# Altium schematic symbol library LTSpiceLibrary.SchLib: 776 symbols (part 2 of 3) (continued)
## LT1723 (continued)
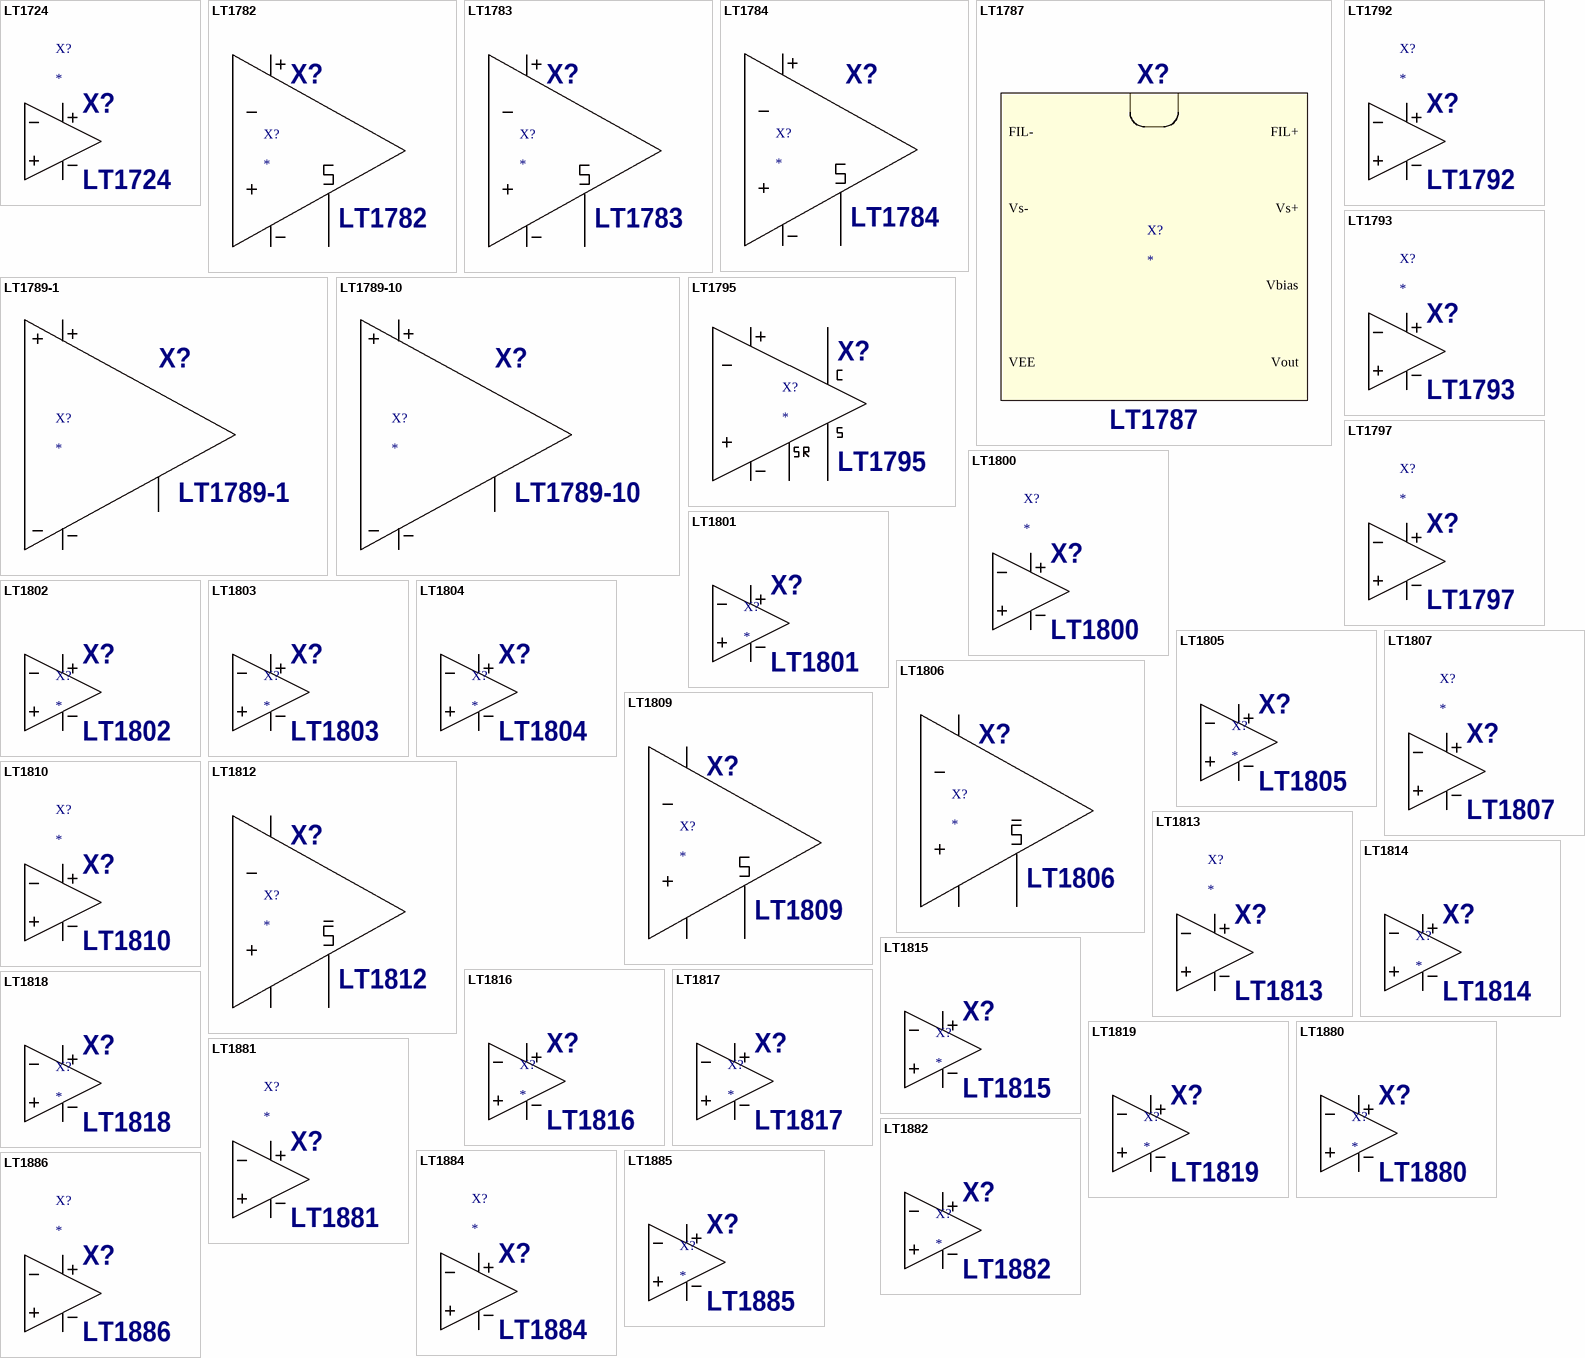
[diagram p11: symbols LT1724 to LT1886]

## LT1724
designator X?  value LT1724  InstName: X?
Prefix: X; Value2: LT1722; Description: Quad 200MHz Low Noise Precision Operational Amplifier; SpiceModel: LTC.lib
pins: 1 In+, 2 In-, 3 V+, 4 V-, 5 OUT

## LT1782
designator X?  value LT1782  InstName: X?
Prefix: X; Description: �Power Over-The-Top, SOT-23, Rail-to-Rail Input and Output Operational Amplifier; SpiceModel: LTC.lib; Value2: LT1782
pins: 1 In+, 2 In-, 3 V+, 4 V-, 5 OUT, 6 SHDN

## LT1783
designator X?  value LT1783  InstName: X?
Prefix: X; Description: 1.2MHz �Power Over-The-Top, SOT-23, Rail-to-Rail Input and Output Operational Amplifier; SpiceModel: LTC.lib; Value2: LT1783
pins: 1 In+, 2 In-, 3 V+, 4 V-, 5 OUT, 6 SHDN

## LT1784
designator X?  value LT1784  InstName: X?
Prefix: X; Description: 2.5MHz Over-The-Top Rail-to-Rail Op Amp; SpiceModel: LTC2.LIB; Value2: LT1784
pins: 1 IN+, 2 IN-, 3 OUT, 4 VCC, 5 VEE, 6 SHDN

## LT1787
designator X?  value LT1787  InstName: X?
Prefix: X; Description: Precision, High Side Current Sense Amplifier; SpiceModel: LTC.lib; Value2: LT1787
pins: 1 FIL-, 2 Vs-, 3 VEE, 4 Vout, 5 Vbias, 6 Vs+, 7 FIL+

## LT1789-1
designator X?  value LT1789-1  InstName: X?
Prefix: X; Description: �Power, Single Supply Rail-to-Rail Output Instrumentation Amplifier; SpiceModel: LTC3.lib; Value2: LT1789-1
pins: 1 RG1, 2 IN-, 3 IN+, 4 VEE, 5 REF, 6 OUT, 7 VCC, 8 RG2

## LT1789-10
designator X?  value LT1789-10  InstName: X?
Prefix: X; Description: �Power, Single Supply Rail-to-Rail Output Instrumentation Amplifier; SpiceModel: LTC3.lib; Value2: LT1789-10
pins: 1 RG1, 2 IN-, 3 IN+, 4 VEE, 5 REF, 6 OUT, 7 VCC, 8 RG2

## LT1792
designator X?  value LT1792  InstName: X?
Prefix: X; Description: Low Noise, Precision, JFET Input Operational Amplifier; SpiceModel: LTC.lib; Value2: LT1792
pins: 1 In+, 2 In-, 3 V+, 4 V-, 5 OUT

## LT1793
designator X?  value LT1793  InstName: X?
Prefix: X; Description: Low Noise, Picoampere Bias Current, JFET Input Operational Amplifier; SpiceModel: LTC.lib; Value2: LT1793
pins: 1 In+, 2 In-, 3 V+, 4 V-, 5 OUT

## LT1795
designator X?  value LT1795  InstName: X?
Prefix: X; Description: Dual 500mA/50MHz Current Feedback Amplifier/xDSL Line Driver; SpiceModel: LTC.lib; Value2: LT1795
pins: 1 In+, 2 In-, 3 V+, 4 V-, 5 OUT, 6 SHDNREF, 7 SHDN, 8 COMP

## LT1797
designator X?  value LT1797  InstName: X?
Prefix: X; Description: 10MHz, Rail-to-Rail Input and Output Op Amp in SOT-23; SpiceModel: LTC.lib; Value2: LT1797
pins: 1 In+, 2 In-, 3 V+, 4 V-, 5 OUT

## LT1800
designator X?  value LT1800  InstName: X?
Prefix: X; Description: 80MHz, 25V/�s Low Power Rail-to-Rail Input and Output Precision Op Amp; SpiceModel: LTC.lib; Value2: LT1800
pins: 1 In+, 2 In-, 3 V+, 4 V-, 5 OUT

## LT1801
designator X?  value LT1801  InstName: X?
Prefix: X; Value2: LT1800; Description: Dual 80MHz, 25V/�s Low Power Rail-to-Rail Input and Output Precision Op Amp(1 of 2); SpiceModel: LTC.lib
pins: 1 In+, 2 In-, 3 V+, 4 V-, 5 OUT

## LT1802
designator X?  value LT1802  InstName: X?
Prefix: X; Value2: LT1800; Description: Quad 80MHz, 25V/�s Low Power Rail-to-Rail Input and Output Precision Op Amp(1 of 4); SpiceModel: LTC.lib
pins: 1 In+, 2 In-, 3 V+, 4 V-, 5 OUT

## LT1803
designator X?  value LT1803  InstName: X?
Prefix: X; Description: 100V/�s, 85MHz Rail-to-Rail Op Amp; SpiceModel: LTC2.LIB; Value2: LT1803
pins: 1 IN+, 2 IN-, 3 OUT, 4 VCC, 5 VEE

## LT1804
designator X?  value LT1804  InstName: X?
Prefix: X; Value2: LT1803; Description: Dual 100V/�s, 85MHz Rail-to-Rail Op Amp; SpiceModel: LTC2.LIB
pins: 1 IN+, 2 IN-, 3 OUT, 4 VCC, 5 VEE

## LT1805
designator X?  value LT1805  InstName: X?
Prefix: X; Value2: LT1803; Description: Quad 100V/�s, 85MHz Rail-to-Rail Op Amp; SpiceModel: LTC2.LIB
pins: 1 IN+, 2 IN-, 3 OUT, 4 VCC, 5 VEE

## LT1806
designator X?  value LT1806  InstName: X?
Prefix: X; Description: 325MHz, Single Rail-to-Rail Input and Output, Low Distortion, Low Noise Precision Operational Amplifier; SpiceModel: LTC.lib; Value2: LT1806
pins: 1 In+, 2 In-, 3 V+, 4 V-, 5 OUT, 6 SHDN

## LT1807
designator X?  value LT1807  InstName: X?
Prefix: X; Description: 325MHz, Dual Rail-to-Rail Input and Output, Low Distortion, Low Noise Precision Operational Amplifier; SpiceModel: LTC.lib; Value2: LT1807
pins: 1 In+, 2 In-, 3 V+, 4 V-, 5 OUT

## LT1809
designator X?  value LT1809  InstName: X?
Prefix: X; Description: Single 180MHz, 350V/�s, Rail-to-Rail Input and Output, Low Distortion, Low Noise Precision Operational Amplifier; SpiceModel: LTC.lib; Value2: LT1809
pins: 1 In+, 2 In-, 3 V+, 4 V-, 5 OUT, 6 SHDN

## LT1810
designator X?  value LT1810  InstName: X?
Prefix: X; Description: Dual 180MHz, 350V/�s, Rail-to-Rail Input and Output, Low Distortion, Low Noise Precision Operational Amplifier; SpiceModel: LTC.lib; Value2: LT1810
pins: 1 In+, 2 In-, 3 V+, 4 V-, 5 OUT

## LT1812
designator X?  value LT1812  InstName: X?
Prefix: X; Description: 325MHz, Single Rail-to-Rail Input and Output, Low Distortion, Low Noise Precision Operational Amplifier; SpiceModel: LTC.lib; Value2: LT1812
pins: 1 In+, 2 In-, 3 V+, 4 V-, 5 OUT, 6 SHDN

## LT1813
designator X?  value LT1813  InstName: X?
Prefix: X; Description: Dual 3mA, 100MHz, 750V/�s Operational Amplifier; SpiceModel: LTC.lib; Value2: LT1813
pins: 1 In+, 2 In-, 3 V+, 4 V-, 5 OUT

## LT1814
designator X?  value LT1814  InstName: X?
Prefix: X; Value2: LT1813; Description: Quad 3mA, 100MHz, 750V/�s Operational Amplifier(1 of 4); SpiceModel: LTC.lib
pins: 1 In+, 2 In-, 3 V+, 4 V-, 5 OUT

## LT1815
designator X?  value LT1815  InstName: X?
Prefix: X; Description: 220MHz, 1500V/�s Operational Amplifier; SpiceModel: LTC2.LIB; Value2: LT1815
pins: 1 IN+, 2 IN-, 3 OUT, 4 VCC, 5 VEE

## LT1816
designator X?  value LT1816  InstName: X?
Prefix: X; Value2: LT1815; Description: Dual 220MHz, 1500V/�s Operational Amplifier; SpiceModel: LTC2.LIB
pins: 1 IN+, 2 IN-, 3 OUT, 4 VCC, 5 VEE

## LT1817
designator X?  value LT1817  InstName: X?
Prefix: X; Value2: LT1815; Description: Quad 220MHz, 1500V/�s Operational Amplifier; SpiceModel: LTC2.LIB
pins: 1 IN+, 2 IN-, 3 OUT, 4 VCC, 5 VEE

## LT1818
designator X?  value LT1818  InstName: X?
Prefix: X; Description: 400MHz, 2500V/�s, 9mA Op Amp; SpiceModel: LTC2.LIB; Value2: LT1818
pins: 1 IN+, 2 IN-, 3 OUT, 4 VCC, 5 VEE

## LT1819
designator X?  value LT1819  InstName: X?
Prefix: X; Value2: LT1818; Description: Dual 400MHz, 2500V/�s, 9mA Op Amp; SpiceModel: LTC2.LIB
pins: 1 IN+, 2 IN-, 3 OUT, 4 VCC, 5 VEE

## LT1880
designator X?  value LT1880  InstName: X?
Prefix: X; Description: Rail-to-Rail Output pA Input Precision Operational Amplifier; SpiceModel: LTC.lib; Value2: LT1880
pins: 1 In+, 2 In-, 3 V+, 4 V-, 5 OUT

## LT1881
designator X?  value LT1881  InstName: X?
Prefix: X; Description: Dual Rail-to-Rail Output pA Input Precision Operational Amplifier; SpiceModel: LTC.lib; Value2: LT1881
pins: 1 In+, 2 In-, 3 V+, 4 V-, 5 OUT

## LT1882
designator X?  value LT1882  InstName: X?
Prefix: X; Value2: LT1881; Description: Quad Rail-to-Rail Output pA Input Precision Operational Amplifier(1 of 4); SpiceModel: LTC.lib
pins: 1 In+, 2 In-, 3 V+, 4 V-, 5 OUT

## LT1884
designator X?  value LT1884  InstName: X?
Prefix: X; Description: Dual Rail-to-Rail Output pA Input Precision Operational Amplifier; SpiceModel: LTC.lib; Value2: LT1884
pins: 1 In+, 2 In-, 3 V+, 4 V-, 5 OUT

## LT1885
designator X?  value LT1885  InstName: X?
Prefix: X; Value2: LT1884; Description: Quad Rail-to-Rail Output pA Input Precision Operational Amplifier(1 of 4); SpiceModel: LTC.lib
pins: 1 In+, 2 In-, 3 V+, 4 V-, 5 OUT

## LT1886
designator X?  value LT1886  InstName: X?
Prefix: X; Description: Dual 700MHz, Av >= 10, 200mA Operational Amplifier; SpiceModel: LTC.lib; Value2: LT1886
pins: 1 In+, 2 In-, 3 V+, 4 V-, 5 OUT

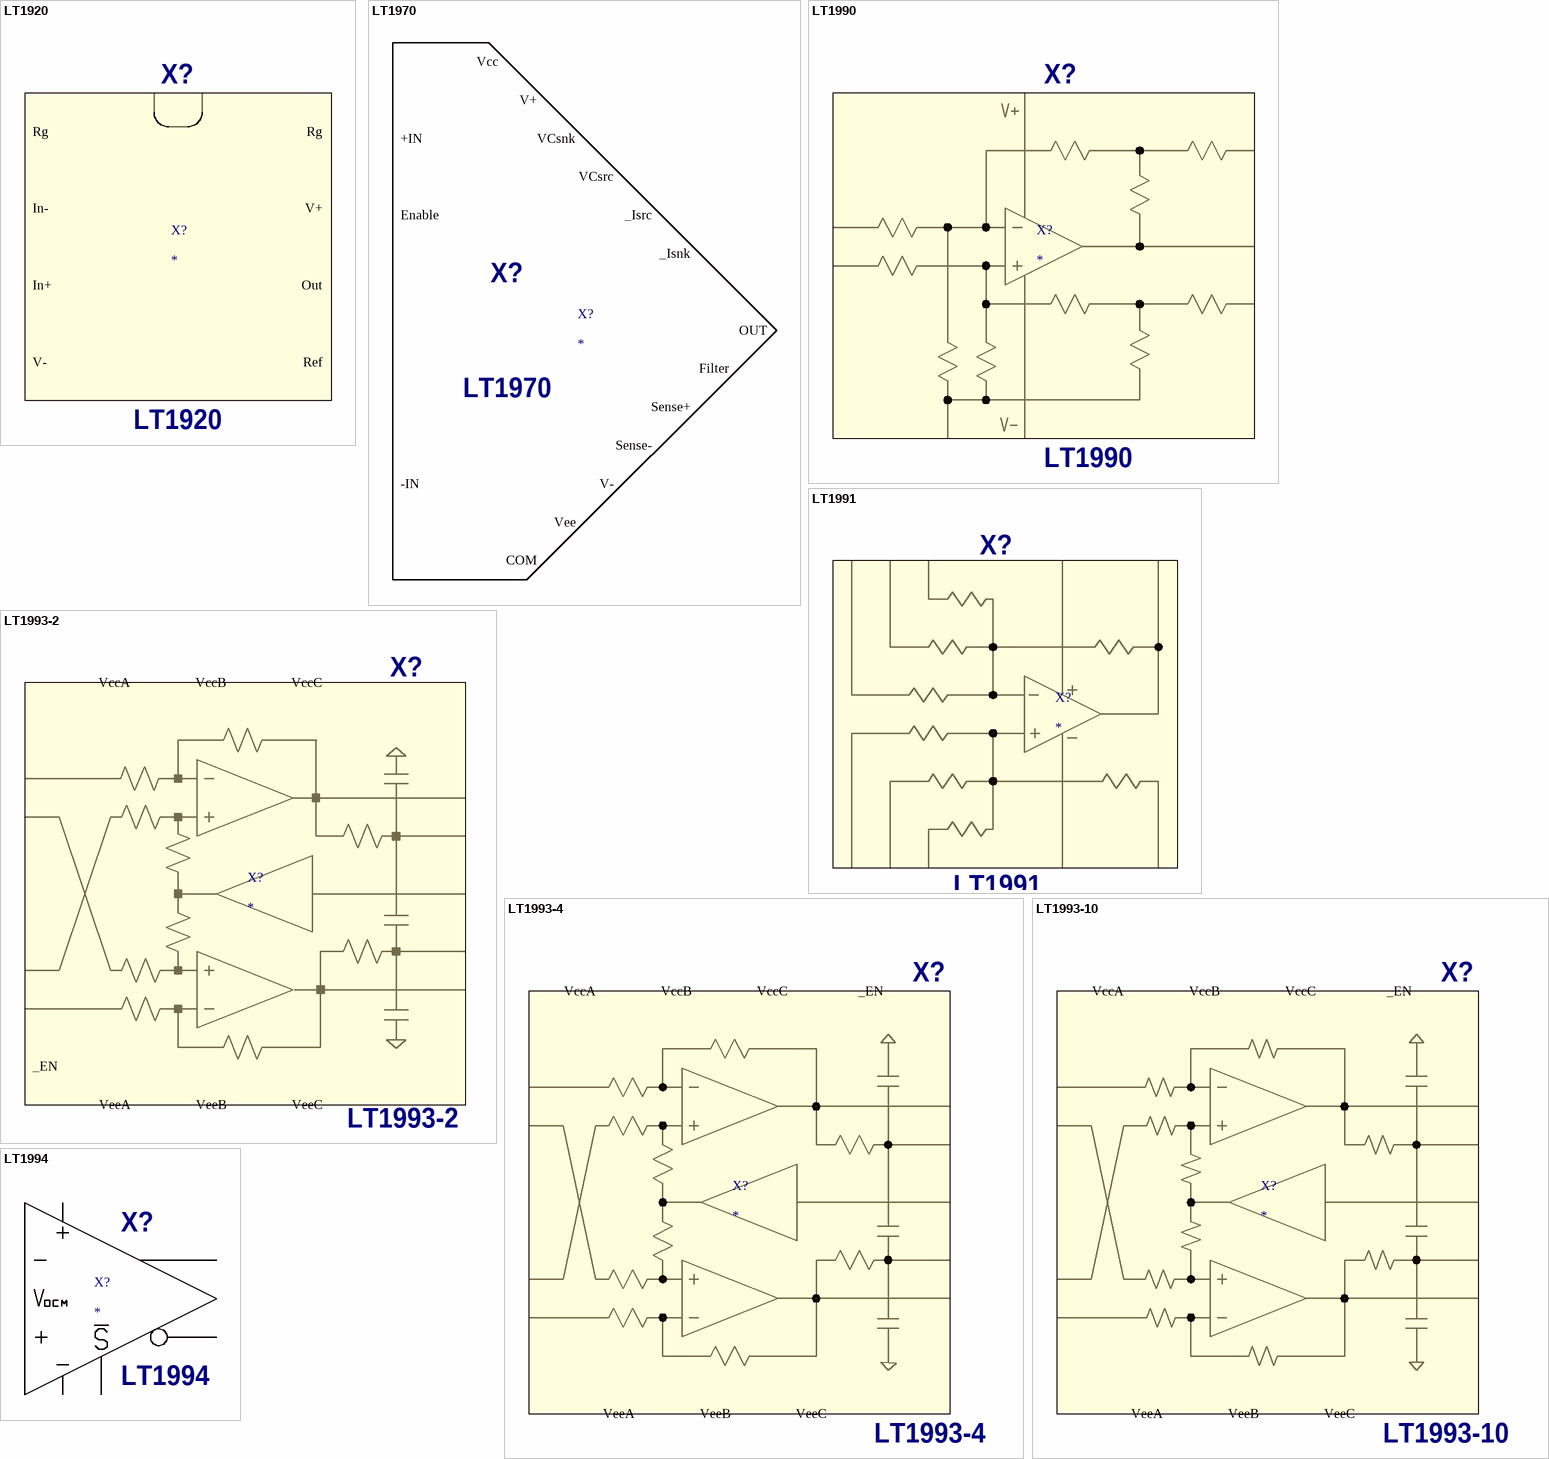
[diagram p12: symbols LT1920 to LT1994]

## LT1920
designator X?  value LT1920  InstName: X?
Prefix: X; Description: Single Resistor Gain Programmable, Precision Instrumentation Amplifier; SpiceModel: LTC.lib; Value2: LT1920
pins: 1 Rg, 2 In-, 3 In+, 4 V-, 5 Ref, 6 Out, 7 V+, 8 Rg

## LT1970
designator X?  value LT1970  InstName: X?
Prefix: X; Description: 500mA Power Op Amp with Adjustable Precision Current Limit; SpiceModel: LTC1.lib; Value2: LT1970
pins: 1 Vee, 2 V-, 3 OUT, 4 Sense+, 5 Filter, 6 Sense-, 7 Vcc, 8 -IN, 9 +IN, 10 VCsnk, 11 VCsrc, 12 COM, 13 Enable, 14 _Isrc, 15 _Isnk, 16 V+

## LT1990
designator X?  value LT1990  InstName: X?
Prefix: X; Description: �250V Input Range G=1,10 �Power Difference Amplifier; SpiceModel: LTC3.lib; Value2: LT1990
pins: 1 REF, 2 IN-, 3 IN+, 4 VEE, 5 GAIN2, 6 OUT, 7 VCC, 8 GAIN1

## LT1991
designator X?  value LT1991  InstName: X?
Prefix: X; Description: Precision, 100�A Gain Selectable Amplifier; SpiceModel: LTC1.lib; Value2: LT1991
pins: 1 P1, 2 P3, 3 P9, 4 Vee, 5 Ref, 6 OUT, 7 VCC, 8 M9, 9 M3, 10 M1

## LT1993-2
designator X?  value LT1993-2  InstName: X?
Prefix: X; Description: 800MHz Low Distortion, Low Noise Differential Amplifier and ADC Driver; SpiceModel: LTC3.LIB; Value2: LT1993-2
pins: 1 VccC, 2 VOCM, 3 VccA, 4 VeeA, 5 +OUT, 6 +OUTFILT, 7 -OUTFILT, 8 -OUT, 9 VeeB, 10 VccB, 11 _EN, 12 VeeC, 13 -INB, 14 -INA, 15 +INB, 16 +INA

## LT1993-4
designator X?  value LT1993-4  InstName: X?
Prefix: X; Description: 900MHz Low Distortion, Low Noise Differential Amplifier and ADC Driver; SpiceModel: LTC3.LIB; Value2: LT1993-4
pins: 1 VccC, 2 VOCM, 3 VccA, 4 VeeA, 5 +OUT, 6 +OUTFILT, 7 -OUTFILT, 8 -OUT, 9 VeeB, 10 VccB, 11 _EN, 12 VeeC, 13 -INB, 14 -INA, 15 +INB, 16 +INA

## LT1993-10
designator X?  value LT1993-10  InstName: X?
Prefix: X; Description: 700MHz Low Distortion, Low Noise Differential Amplifier and ADC Driver; SpiceModel: LTC3.LIB; Value2: LT1993-10
pins: 1 VccC, 2 VOCM, 3 VccA, 4 VeeA, 5 +OUT, 6 +OUTFILT, 7 -OUTFILT, 8 -OUT, 9 VeeB, 10 VccB, 11 _EN, 12 VeeC, 13 -INB, 14 -INA, 15 +INB, 16 +INA

## LT1994
designator X?  value LT1994  InstName: X?
Prefix: X; Description: Low Noise, Low Distortion Fully Differential I/O Amplifier/Driver; SpiceModel: LTC3.lib; Value2: LT1994
pins: 1 IN-, 2 VOCM, 3 V+, 4 OUT+, 5 OUT-, 6 V-, 7 SHDN, 8 IN+

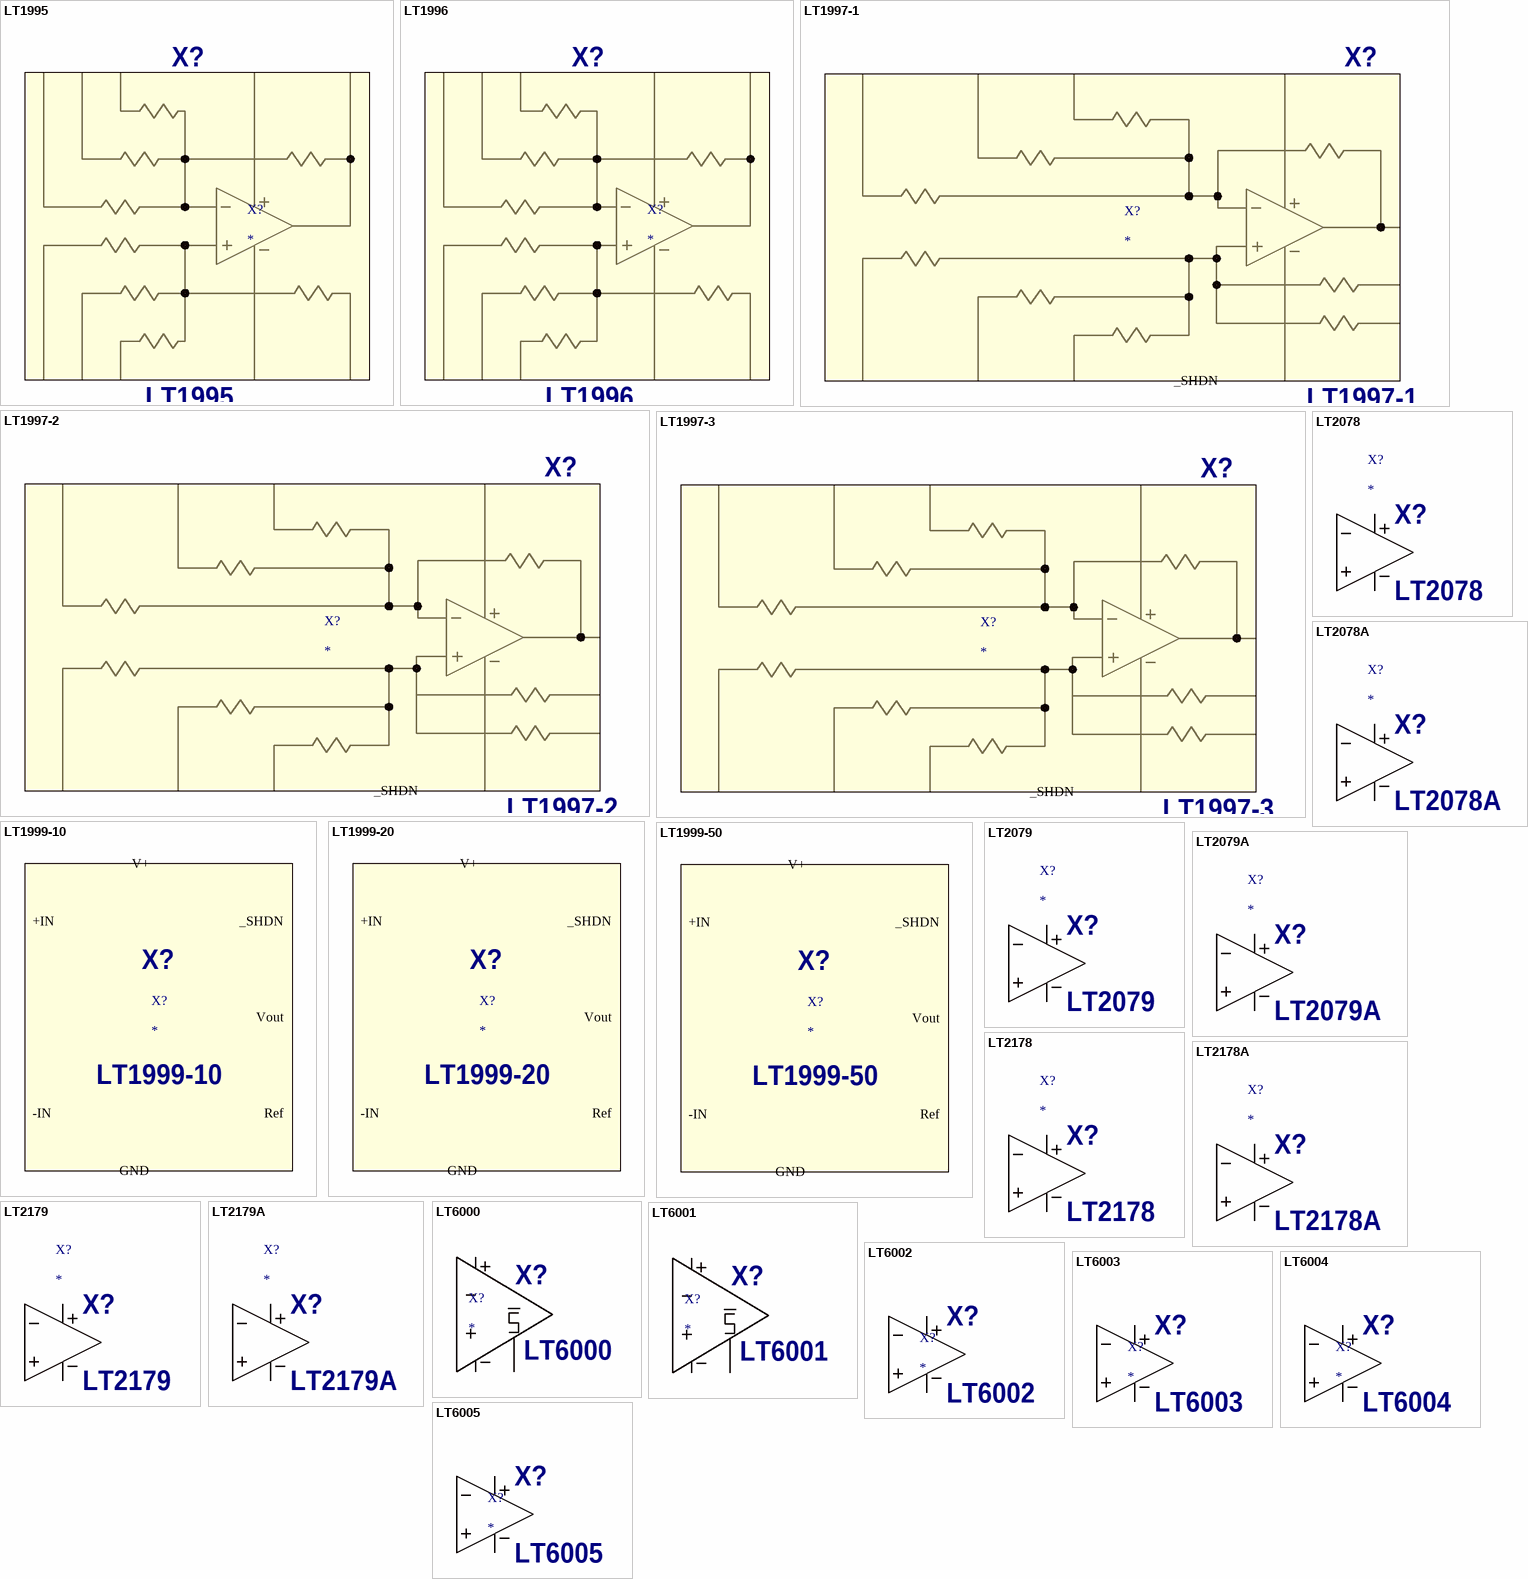
[diagram p13: symbols LT1995 to LT6005]

## LT1995
designator X?  value LT1995  InstName: X?
Prefix: X; Description: 30MHz, 1000V/�s Gain Selectable Amplifier; SpiceModel: LTC7.lib; Value2: LT1995
pins: 1 P1, 2 P2, 3 P4, 4 Vee, 5 Ref, 6 OUT, 7 VCC, 8 M4, 9 M2, 10 M1

## LT1996
designator X?  value LT1996  InstName: X?
Prefix: X; Description: Precision, 100�A Gain Selectable Amplifier; SpiceModel: LTC1.lib; Value2: LT1996
pins: 1 P9, 2 P27, 3 P81, 4 Vee, 5 Ref, 6 OUT, 7 VCC, 8 M81, 9 M27, 10 M9

## LT1997-1
designator X?  value LT1997-1  InstName: X?
Prefix: X; Description: Precision, High Voltage, Gain Selectable Difference/Current Sense Amplifier; SpiceModel: LTC6.lib; Value2: LT1997-1
pins: 1 +INA, 2 +INB, 3 +INC, 4 REF1, 5 REF2, 6 V-, 7 OUT, 8 _SHDN, 9 V+, 10 -INC, 11 -INB, 12 -INA

## LT1997-2
designator X?  value LT1997-2  InstName: X?
Prefix: X; Description: Precision, Wide Voltage Range Gain Selectable Funnel Amplifier; SpiceModel: LTC6.lib; Value2: LT1997-2
pins: 1 +INA, 2 +INB, 3 +INC, 4 REF1, 5 REF2, 6 V-, 7 OUT, 8 _SHDN, 9 V+, 10 -INC, 11 -INB, 12 -INA

## LT1997-3
designator X?  value LT1997-3  InstName: X?
Prefix: X; Description: Precision, Wide Voltage Range Gain Selectable Amplifier; SpiceModel: LTC6.lib; Value2: LT1997-3
pins: 1 +INA, 2 +INB, 3 +INC, 4 REF1, 5 REF2, 6 V-, 7 OUT, 8 _SHDN, 9 V+, 10 -INC, 11 -INB, 12 -INA

## LT1999-10
designator X?  value LT1999-10  InstName: X?
Prefix: X; Value2: LT1999-x Gain=10; Description: High Voltage, Bidirectional Current Sense Amplifier; SpiceModel: LTC6.lib
pins: 1 V+, 2 +IN, 3 -IN, 4 GND, 5 Ref, 6 Vout, 7 _SHDN

## LT1999-20
designator X?  value LT1999-20  InstName: X?
Prefix: X; Value2: LT1999-x Gain=20; Description: High Voltage, Bidirectional Current Sense Amplifier; SpiceModel: LTC6.lib
pins: 1 V+, 2 +IN, 3 -IN, 4 GND, 5 Ref, 6 Vout, 7 _SHDN

## LT1999-50
designator X?  value LT1999-50  InstName: X?
Prefix: X; Value2: LT1999-x Gain=50; Description: High Voltage, Bidirectional Current Sense Amplifier; SpiceModel: LTC6.lib
pins: 1 V+, 2 +IN, 3 -IN, 4 GND, 5 Ref, 6 Vout, 7 _SHDN

## LT2078
designator X?  value LT2078  InstName: X?
Prefix: X; Value2: LT1078; Description: Dual �Power, Single Supply Precision Operational Amplifier; SpiceModel: LTC.lib
pins: 1 In+, 2 In-, 3 V+, 4 V-, 5 OUT

## LT2078A
designator X?  value LT2078A  InstName: X?
Prefix: X; Value2: LT1078; Description: Dual �Power, Single Supply Precision Operational Amplifier; SpiceModel: LTC.lib
pins: 1 In+, 2 In-, 3 V+, 4 V-, 5 OUT

## LT2079
designator X?  value LT2079  InstName: X?
Prefix: X; Value2: LT1078; Description: Quad �Power, Single Supply Precision Operational Amplifier; SpiceModel: LTC.lib
pins: 1 In+, 2 In-, 3 V+, 4 V-, 5 OUT

## LT2079A
designator X?  value LT2079A  InstName: X?
Prefix: X; Value2: LT1078; Description: Quad �Power, Single Supply Precision Operational Amplifier; SpiceModel: LTC.lib
pins: 1 In+, 2 In-, 3 V+, 4 V-, 5 OUT

## LT2178
designator X?  value LT2178  InstName: X?
Prefix: X; Value2: LT1178; Description: Quad 17mA Max, Single Supply Precision Operational Amplifier; SpiceModel: LTC.lib
pins: 1 In+, 2 In-, 3 V+, 4 V-, 5 OUT

## LT2178A
designator X?  value LT2178A  InstName: X?
Prefix: X; Value2: LT1178; Description: Quad 17mA Max, Single Supply Precision Operational Amplifier; SpiceModel: LTC.lib
pins: 1 In+, 2 In-, 3 V+, 4 V-, 5 OUT

## LT2179
designator X?  value LT2179  InstName: X?
Prefix: X; Value2: LT1178; Description: Quad 17mA Max, Single Supply Precision Operational Amplifier; SpiceModel: LTC.lib
pins: 1 In+, 2 In-, 3 V+, 4 V-, 5 OUT

## LT2179A
designator X?  value LT2179A  InstName: X?
Prefix: X; Value2: LT1178; Description: Quad 17mA Max, Single Supply Precision Operational Amplifier; SpiceModel: LTC.lib
pins: 1 In+, 2 In-, 3 V+, 4 V-, 5 OUT

## LT6000
designator X?  value LT6000  InstName: X?
Prefix: X; Description: 1.8V, 13�A Precision Rail-to-Rail Op Amp; SpiceModel: LTC5.lib; Value2: LT6000
pins: 1 IN+, 2 IN-, 3 VCC, 4 VEE, 5 OUT, 6 SHDN_L

## LT6001
designator X?  value LT6001  InstName: X?
Prefix: X; Value2: LT6000; Description: Dual 1.8V, 13�A Precision Rail-to-Rail Op Amp; SpiceModel: LTC5.lib
pins: 1 IN+, 2 IN-, 3 VCC, 4 VEE, 5 OUT, 6 SHDN_L

## LT6002
designator X?  value LT6002  InstName: X?
Prefix: X; Description: Quad 1.8V, 13�A Precision Rail-to-Rail Op Amps; SpiceModel: LTC5.lib; Value2: LT6002
pins: 1 IN+, 2 IN-, 3 VCC, 4 VEE, 5 OUT

## LT6003
designator X?  value LT6003  InstName: X?
Prefix: X; Description: 1.6V, 1�A Precision Rail-to-Rail Input and Output Op Amp; SpiceModel: LTC5.lib; Value2: LT6003
pins: 1 IN+, 2 IN-, 3 VCC, 4 VEE, 5 OUT

## LT6004
designator X?  value LT6004  InstName: X?
Prefix: X; Value2: LT6003; Description: Dual 1.6V, 1�A Precision Rail-to-Rail Input and Output Op Amp; SpiceModel: LTC5.lib
pins: 1 IN+, 2 IN-, 3 VCC, 4 VEE, 5 OUT

## LT6005
designator X?  value LT6005  InstName: X?
Prefix: X; Value2: LT6003; Description: Quad 1.6V, 1�A Precision Rail-to-Rail Input and Output Op Amp; SpiceModel: LTC5.lib
pins: 1 IN+, 2 IN-, 3 VCC, 4 VEE, 5 OUT

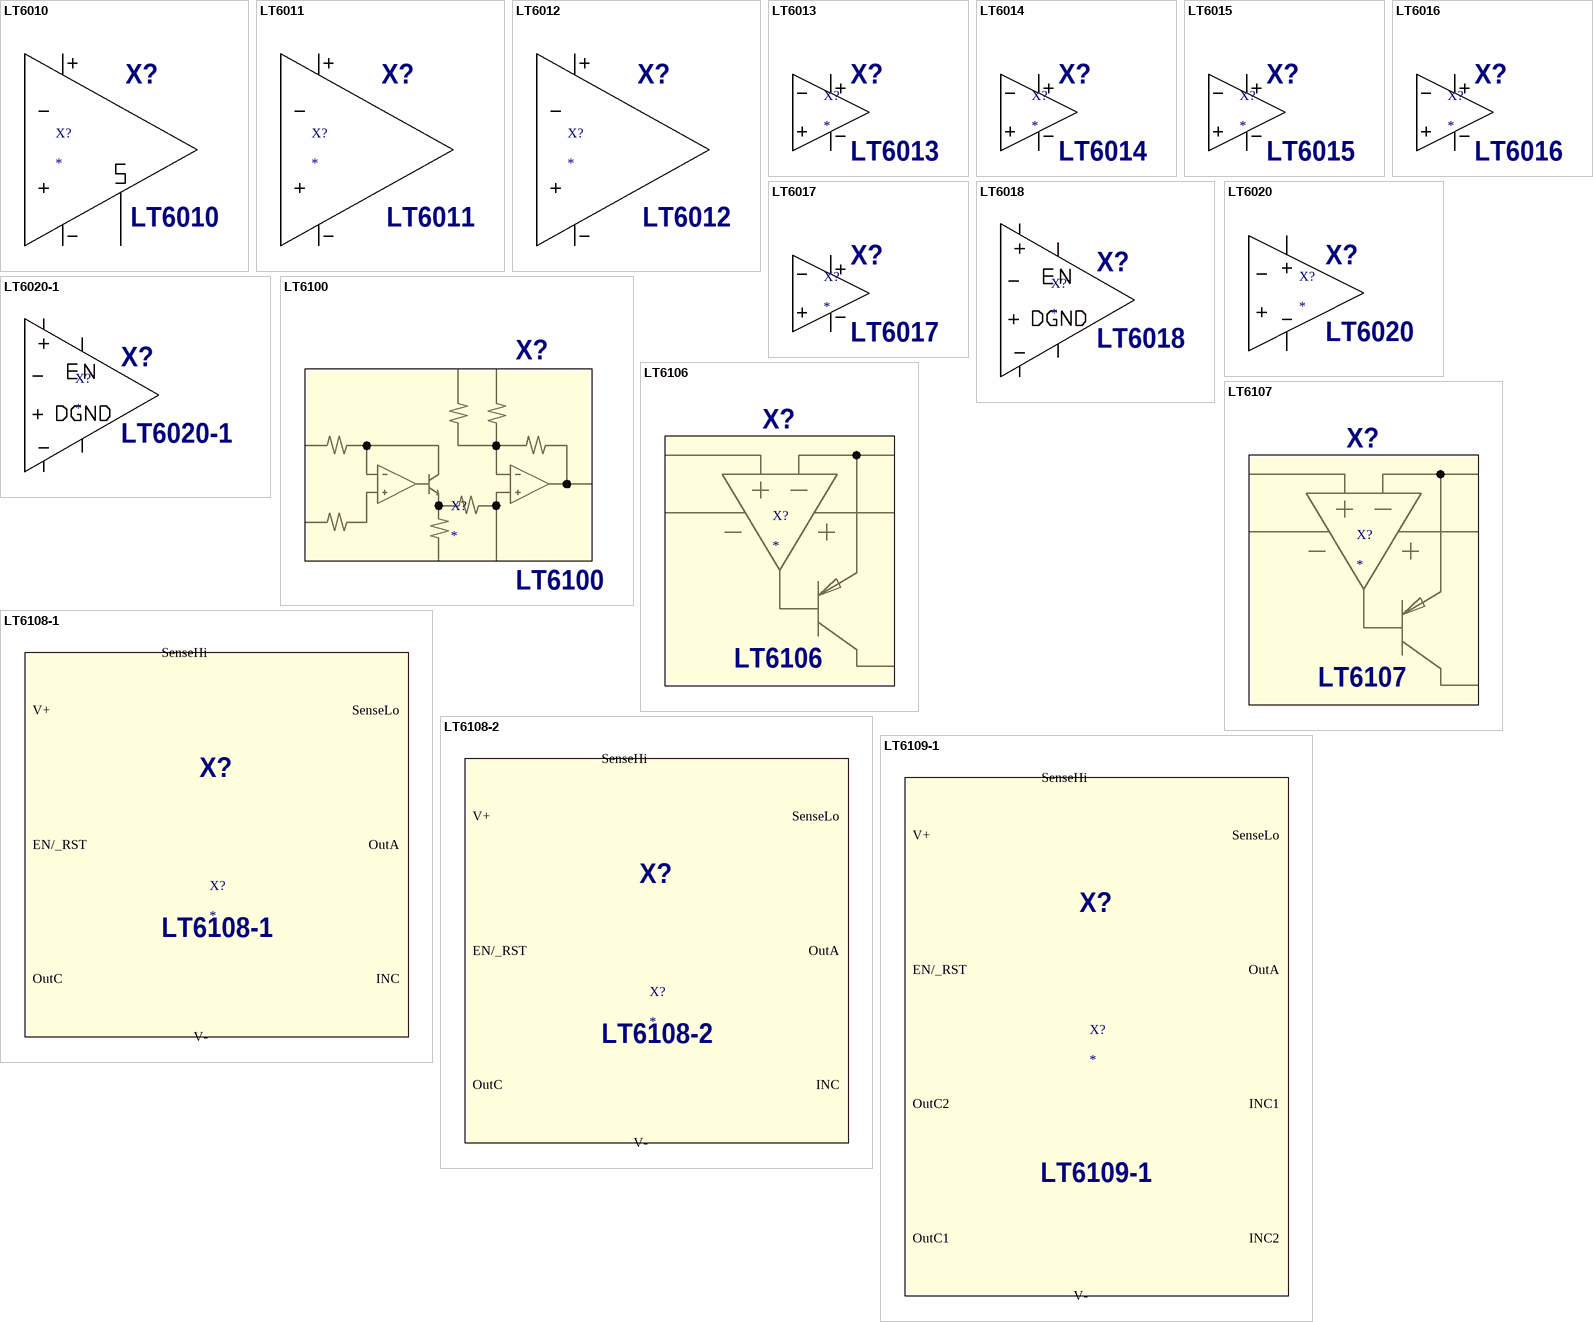
[diagram p14: symbols LT6010 to LT6109-1]

## LT6010
designator X?  value LT6010  InstName: X?
Prefix: X; Description: 135�A, 14nV/rtHz, Rail-to-Rail Precision Op Amp; SpiceModel: LTC2.LIB; Value2: LT6010
pins: 1 IN+, 2 IN-, 3 OUT, 4 VCC, 5 VEE, 6 SHDN

## LT6011
designator X?  value LT6011  InstName: X?
Prefix: X; Description: Dual 135�A, 14nV/rtHz, Rail-to-Rail Precision Op Amp; SpiceModel: LTC2.LIB; Value2: LT6011
pins: 1 IN+, 2 IN-, 3 OUT, 4 VCC, 5 VEE

## LT6012
designator X?  value LT6012  InstName: X?
Prefix: X; Value2: LT6011; Description: Quad 135�A, 14nV/rtHz, Rail-to-Rail Precision Op Amp; SpiceModel: LTC2.LIB
pins: 1 IN+, 2 IN-, 3 OUT, 4 VCC, 5 VEE

## LT6013
designator X?  value LT6013  InstName: X?
Prefix: X; Description: 145�A, 9.5nV/rtHz, Av > 5, Rail-to-Rail Precision Op Amp; SpiceModel: LTC2.LIB; Value2: LT6013
pins: 1 IN+, 2 IN-, 3 OUT, 4 VCC, 5 VEE

## LT6014
designator X?  value LT6014  InstName: X?
Prefix: X; Value2: LT6013; Description: Dual 145�A, 9.5nV/rtHz, Av > 5, Rail-to-Rail Op Amp; SpiceModel: LTC2.LIB
pins: 1 IN+, 2 IN-, 3 OUT, 4 VCC, 5 VEE

## LT6015
designator X?  value LT6015  InstName: X?
Prefix: X; Value2: LT6016; Description: 3.2MHz, 0.8 V/�s Low Power, Over-The-Top Precision Op Amp; SpiceModel: LTC2.LIB
pins: 1 IN+, 2 IN-, 3 VCC, 4 VEE, 5 OUT

## LT6016
designator X?  value LT6016  InstName: X?
Prefix: X; Description: 3.2MHz, 0.8 V/�s Low Power, Over-The-Top Precision Op Amp; SpiceModel: LTC2.LIB; Value2: LT6016
pins: 1 IN+, 2 IN-, 3 VCC, 4 VEE, 5 OUT

## LT6017
designator X?  value LT6017  InstName: X?
Prefix: X; Value2: LT6016; Description: 3.2MHz, 0.8 V/�s Low Power, Over-The-Top Precision Op Amp; SpiceModel: LTC2.LIB
pins: 1 IN+, 2 IN-, 3 VCC, 4 VEE, 5 OUT

## LT6018
designator X?  value LT6018  InstName: X?
Prefix: X; Description: 36V, Ultralow Noise, Precision Op Amp; SpiceModel: LT6018.lib; Value2: LT6018
pins: 1 IN+, 2 IN-, 3 V+, 4 V-, 5 OUT, 6 EN, 7 DGND

## LT6020
designator X?  value LT6020  InstName: X?
Prefix: X; Description: Dual �Power, 5V/�s Precision Rail-to-Rail Output Amplifier; SpiceModel: LTC3.lib; Value2: LT6020
pins: 1 IN+, 2 IN-, 3 V+, 4 V-, 5 OUT

## LT6020-1
designator X?  value LT6020-1  InstName: X?
Prefix: X; Description: Dual �Power, 5V/�s Precision Rail-to-Rail Output Amplifier; SpiceModel: LTC3.lib; Value2: LT6020-1
pins: 1 IN+, 2 IN-, 3 V+, 4 V-, 5 OUT, 6 EN, 7 DGND

## LT6100
designator X?  value LT6100  InstName: X?
Prefix: X; Description: Precision, Gain Selectable High Side Current Sense Amplifier; SpiceModel: LTC3.lib; Value2: LT6100
pins: 1 VS-, 2 VCC, 3 FIL, 4 VEE, 5 VOUT, 6 A2, 7 A4, 8 VS+

## LT6106
designator X?  value LT6106  InstName: X?
Prefix: X; Description: High Voltage, High-Side Current Sense in SOT-23; SpiceModel: LTC7.lib; Value2: LT6106
pins: 1 OUT, 2 VEE, 3 IN-, 4 IN+, 5 VCC

## LT6107
designator X?  value LT6107  InstName: X?
Prefix: X; Value2: LT6106; Description: High Voltage, High-Side Current Sense in SOT-23; SpiceModel: LTC7.lib
pins: 1 OUT, 2 VEE, 3 IN-, 4 IN+, 5 VCC

## LT6108-1
designator X?  value LT6108-1  InstName: X?
Prefix: X; Description: High Side Current Sense Amplifier with Reference and Comparators\n\nNote: The reset signal must be applied on startup.  Model does not reflect this.; SpiceModel: LTC5.lib; Value2: LT6108-1
pins: 1 SenseLo, 2 EN/_RST, 3 OutC, 4 V-, 5 INC, 6 OutA, 7 V+, 8 SenseHi

## LT6108-2
designator X?  value LT6108-2  InstName: X?
Prefix: X; Description: High Side Current Sense Amplifier with Reference and Comparators; SpiceModel: LTC5.lib; Value2: LT6108-2
pins: 1 SenseLo, 2 EN/_RST, 3 OutC, 4 V-, 5 INC, 6 OutA, 7 V+, 8 SenseHi
